# Altium footprint library smdComponent.PcbLib: 182 footprints (part 12 of 12)
Each footprint in its own frame and in the unit in brackets; x right, y up, seen from the top. Pads: shape width x height; smd on the part's side, far side on the other; paste and mask are expansions set on the pad; w line width, h text height; cw(c..) or ccw(c..) is an arc to the next point about the centre after c.
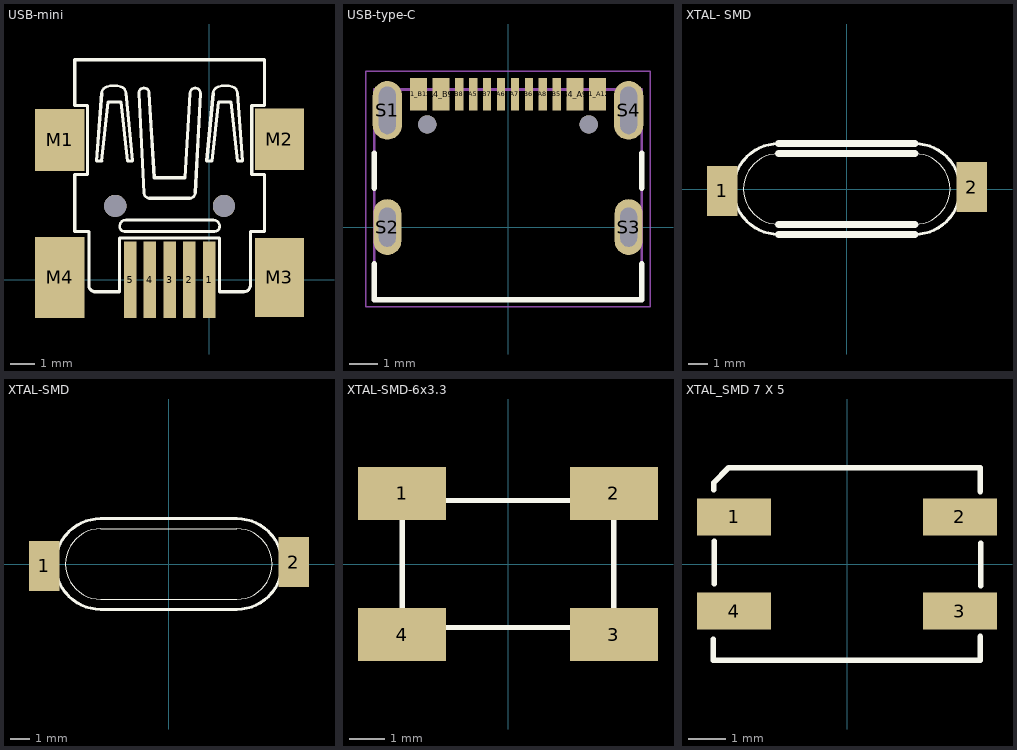
[diagram p11: the footprints below, top view; thin cyan lines are the x and y axes]

## USB-mini [mm]
pads (11):
  rect 0.5x3.1 smd: 1(0,0) 2(-0.8,0) 3(-1.6,0) 4(-2.4,0) 5(-3.2,0)
  rect 2x2.5 smd: M1(-6.05,5.67) M2(2.85,5.695)
  rect 2x3.2 smd: M3(2.85,0.1)
  rect 2x3.3 smd: M4(-6.05,0.1)
  round 0.9 on Top hole 0.9: ""(-3.8,3) ""(0.6,3)
Top Overlay:
  lines w0.102: -4.351,7.569 cw(c-4.057,7.546) -4.144,7.828 cw(c-3.858,6.897) -3.573,7.828 cw(c-3.659,7.546) -3.365,7.569 ; -3.417,1.962 cw(c-3.417,2.169) -3.624,2.17 cw(c-3.365,2.169) -3.365,2.429 ; -2.846,7.569 cw(c-2.638,7.569) -2.638,7.776 cw(c-2.638,7.569) -2.43,7.569 ; -2.638,3.519 ccw(c-2.418,3.531) -2.43,3.312 ; -0.769,3.312 ccw(c-0.781,3.531) -0.562,3.519 ; -0.769,7.569 cw(c-0.562,7.569) -0.562,7.776 cw(c-0.562,7.569) -0.354,7.569 ; 0.165,2.429 cw(c0.165,2.169) 0.425,2.17 cw(c0.217,2.169) 0.217,1.962 ; 0.165,7.569 cw(c0.459,7.546) 0.373,7.828 cw(c0.658,6.897) 0.944,7.828 cw(c0.858,7.546) 1.151,7.569
  lines w0.127: -5.442,1.962 -5.441,4.271 -4.927,4.271 -4.927,7.065 -5.441,7.065 -5.441,8.918 ; -5.435,1.96 -4.87,1.96 -4.87,-0.219 ccw(c-4.611,-0.219) -4.611,-0.478 -3.625,-0.478 -3.625,1.7 0.425,1.7 0.425,-0.477 1.411,-0.477 ; -4.351,7.569 -4.559,4.817 -4.351,4.817 -4.092,7.205 -3.573,7.205 -3.313,4.817 -3.105,4.817 -3.365,7.569 ; -3.417,1.962 0.217,1.962 ; -3.365,2.429 0.165,2.429 ; -2.846,7.568 -2.638,3.519 ; -2.43,3.312 -0.769,3.312 ; -2.43,7.569 -2.223,4.142 -0.977,4.142 -0.769,7.569 ; -0.562,3.519 -0.354,7.568 ; 0.165,7.569 -0.094,4.817 0.113,4.817 0.373,7.205 0.892,7.205 1.151,4.817 1.359,4.817 1.151,7.569 ; 1.411,-0.477 ccw(c1.411,-0.218) 1.671,-0.217 1.671,1.963 ; 1.67,1.96 2.235,1.96 ; 2.241,1.962 2.242,4.271 1.727,4.271 1.727,7.065 2.242,7.065 2.242,8.918 ; 2.241,7.415 2.242,8.918 ; -5.441,8.918 -5.441,8.918 ; -5.441,8.918 2.242,8.918 ; -0.562,7.776 -0.562,7.776 ; 0.425,2.169 0.425,2.17
3D body "User Library-usb_mini_smd.step": height 4.14, standoff -0.95, extent -6.674,-0.31 3.226,8.89

## USB-type-C [mm]
pads (18):
  rect 0.6x1.15 smd: A1_B12(-3.2,4.755) A4_B9(-2.4,4.755) B1_A12(3.2,4.755) B4_A9(2.4,4.755)
  rect 0.3x1.15 smd: A5(-1.25,4.755) A6(-0.25,4.755) A7(0.25,4.755) A8(1.25,4.755) B5(1.75,4.755) B6(0.75,4.755) B7(-0.75,4.755) B8(-1.75,4.755)
  oval 1.05x2.1 hole 0.6 slot 1.7 at 90 deg: S1(-4.32,4.18) S4(4.32,4.18)
  oval 1x2 hole 0.6 slot 1.4 at 90 deg: S2(-4.32,0) S3(4.32,0)
  round 0.65 hole 0.65 unplated: ""(-2.89,3.68) ""(2.89,3.68)
Top Overlay:
  lines w0.2: -4.79,-1.32 -4.79,-2.6 4.79,-2.6 4.79,-1.32 ; -4.79,1.4 -4.79,2.65 ; 4.79,1.4 4.79,2.65
Mechanical 13:
  lines w0.1: -4.79,-2.6 -4.79,4.93 4.79,4.93 4.79,-2.6 -4.79,-2.6
Mechanical 15:
  lines w0.05: -5.1,-2.85 5.1,-2.85 5.1,5.58 -5.1,5.58 -5.1,-2.85
3D body "step_temp.STEP": height 3.31, standoff -0.85, extent -4.79,-2.585 4.79,5.125

## XTAL- SMD [mm]
pads (2):
  rect 1.524x2.54 smd: 1(-6.275,-0.1) 2(6.3,0.1)
Top Overlay:
  lines w0.051: -3.429,-1.778 cw(c-3.429,0) -3.429,1.778 ; 3.429,-1.778 ccw(c3.429,0) 3.429,1.778
  lines w0.152: -3.429,-2.286 cw(c-3.429,0) -3.429,2.286 ; 3.429,-2.286 ccw(c3.429,0) 3.429,2.286
  lines w0.349: -3.429,-2.286 3.429,-2.286 ; -3.429,-1.778 3.429,-1.778 ; -3.429,1.778 3.429,1.778 ; -3.429,2.286 3.429,2.286
3D body "User Library-SMU4.STEP": height 3.92, standoff -0.08, extent -6.275,-2.5 6.225,2.3

## XTAL-SMD [mm]
pads (2):
  rect 1.524x2.54 smd: 1(-6.275,-0.1) 2(6.3,0.1)
Top Overlay:
  lines w0.051: -3.429,-1.778 cw(c-3.429,0) -3.429,1.778 3.429,1.778 cw(c3.429,0) 3.429,-1.778 -3.429,-1.778
  lines w0.152: -3.429,-2.286 cw(c-3.429,0) -3.429,2.286 3.429,2.286 cw(c3.429,0) 3.429,-2.286 -3.429,-2.286
3D body "User Library-SMU4.STEP": height 3.92, standoff -0.08, extent -6.275,-2.5 6.225,2.3

## XTAL-SMD-6x3.3 [mm]
pads (4):
  rect 2.5x1.5 smd: 1(-3,2) 2(3,2) 3(3,-2) 4(-3,-2)
Top Overlay:
  lines w0.15: -3,-1.5 -3,1.5 -2.7,1.8 2.7,1.8 3,1.5 3,-1.6 2.8,-1.8 -2.7,-1.8 -3,-1.5
3D body "User Library-ABMM2.STEP": height 1.21, standoff 0, extent -3,-1.8 3,1.8

## XTAL_SMD 7 X 5 [mm]
pads (4):
  rect 2x1 smd: 1(-3.048,1.27) 2(3.048,1.27) 3(3.048,-1.27) 4(-3.048,-1.27)
Top Overlay:
  lines w0.15: -3.607,-2.032 -3.607,-2.6 3.6,-2.6 3.6,-1.956 ; -3.6,2.007 -3.6,2.191 -3.191,2.6 3.6,2.6 3.6,1.956 ; -3.581,-0.533 -3.581,0.61 ; 3.607,-0.584 3.607,0.559
3D body "User Library-ABMM.STEP": height 1.3, standoff 0, extent -3.6,-2.6 3.6,2.6